# Altium footprint library Footprint.PcbLib: 137 footprints (part 9 of 9)
Each footprint in its own frame and in the unit in brackets; x right, y up, seen from the top. Pads: shape width x height; smd on the part's side, far side on the other; paste and mask are expansions set on the pad; w line width, h text height; cw(c..) or ccw(c..) is an arc to the next point about the centre after c.
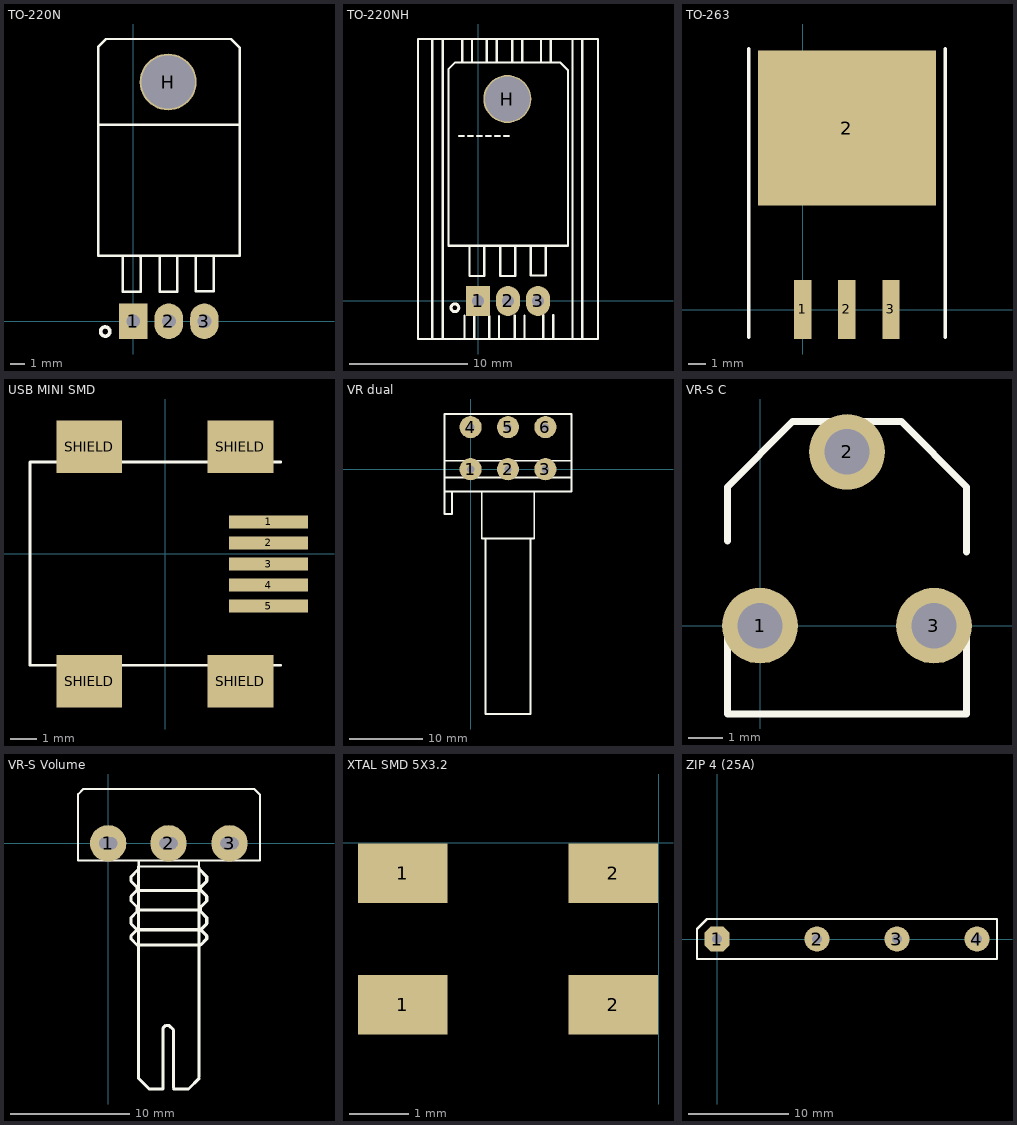
[diagram p8: the footprints below, top view; thin cyan lines are the x and y axes]

## TO-220N [mil] "TO-220 - 1-2-3"
height 200
pads (4):
  rect 80x100 hole 39: 1(0,0)
  oval 80x100 hole 39: 2(100,0) 3(200,0)
  round 160 hole 150: H(98,673)
Top Overlay:
  circle w10: c-79.03,-29 r12.97
  lines w7: -99,549 -99,772 -77,794 275,794 300,769 300,730 ; -99,552 -99,184 300,184 300,553 -98,553 ; -29,178 -29,83 21,83 21,180 20,181 ; 74,178 74,83 124,83 124,180 123,181 ; 176,180 176,85 226,85 226,182 225,183 ; 300,552 300,733
3D body "SW3dPS-mje-700 and 800.STEP": height 121, standoff -160, extent -48,-10.31 252,792.31

## TO-220NH [mil] "TO-220 - 1-2-3"
height 200
pads (4):
  rect 80x100 hole 39: 1(0,0)
  oval 80x100 hole 39: 2(100,0) 3(200,0)
  round 160 hole 150: H(98,673)
Top Overlay:
  circle w10: c-77.03,-23 r12.97
  lines w7: -99,549 -99,772 -77,794 275,794 300,769 300,730 ; -99,552 -99,184 300,184 300,553 ; -29,178 -29,83 21,83 21,180 20,181 ; 74,178 74,83 124,83 124,180 123,181 ; 176,180 176,85 226,85 226,182 225,183 ; 300,552 300,733
  lines w8: -152,-127 -152,873 ; -117,-127 -117,873 ; -53,796 -53.01,869.97 ; -45,-124 -45.01,-50.03 ; -20,796 -20.01,869.97 ; -12,-124 -12.01,-50.03 ; 29,795 28.99,868.97 ; 37,-125 36.99,-51.03 ; 62,795 61.99,868.97 ; 70,-125 69.99,-51.03 ; 114,796 113.99,869.97 ; 122,-124 121.99,-50.03 ; 147,796 146.99,869.97 ; 155,-124 154.99,-50.03 ; 210,798 209.99,871.97 ; 218,-122 217.99,-48.03 ; 243,798 242.99,871.97 ; 251,-122 250.99,-48.03 ; 315,-127 315,873 ; 348,-127 348,873 ; -200,-127 -200,873 400,873 400,-127 -200,-127
  text "------" at -69,527 h60
3D body "SW3DPS-TO-220-DEFAULT.STEP": height 165.35, standoff -118.11, extent -100,-3.66 300,763.66

## TO-263 [mm] "TO-263"
pads (4):
  rect 1x3.4 smd: 1(-0.006,0.009) 2(2.534,0.009) 3(5.074,0.009)
  rect 10.25x8.9 smd: 2(2.534,10.459)
Top Overlay:
  lines w0.2: -3.106,-1.591 -3.106,15.009 ; 8.194,-1.591 8.194,15.009
3D body: height 0.5, standoff 0, extent -0.381,-1.143 0.381,1.01
3D body: height 4.5, standoff 0, extent -2.46,3.81 7.54,13.01
3D body: height 1.3, standoff 0, extent -2.46,13.01 7.54,14.21
3D body: height 2.9, standoff 2.4, extent -0.6,1.01 0.6,3.81
3D body: height 2.9, standoff 2.4, extent 1.94,2.375 3.14,3.81
3D body: height 2.9, standoff 2.4, extent 4.475,1 5.675,3.8
3D body: height 0.5, standoff 0, extent 4.694,-1.153 5.456,1
3D body: height 2.9, standoff 0, extent -0.381,0.76 0.381,1.26
3D body: height 2.9, standoff 0, extent 4.694,0.75 5.456,1.25

## USB MINI SMD [mm] "USB MINI SMD"
pads (9):
  rect 3x0.5 smd: 1(3.929,1.219) 2(3.929,0.419) 3(3.929,-0.381) 4(3.929,-1.181) 5(3.929,-1.981)
  rect 2.5x2 smd: SHIELD(-2.889,-4.831) SHIELD(-2.889,4.069) SHIELD(2.861,-4.831) SHIELD(2.861,4.069)
Top Overlay:
  lines w0.1: 4.386,-4.231 -5.139,-4.231 -5.139,3.494 4.386,3.494
  text "." at 4.754,2.219 h0.5
3D body "USB_mini_B.STEP": height 3.95, standoff -1, extent -5.746,-5.756 3.454,4.944

## VR dual [mm] "VR doi volume"
pads (6):
  round 3 hole 1: 1(0,0) 2(5.08,0) 3(10.16,0) 4(0,5.715) 5(5.08,5.715) 6(10.16,5.715)
Top Overlay:
  lines w0.254: -3.556,-3.048 13.716,-3.048 13.716,7.493 -3.556,7.493 -3.556,-6.096 -2.54,-6.096 -2.54,-3.048 ; -3.556,-1.143 13.716,-1.143 ; -3.556,1.143 13.716,1.143 ; 1.524,-3.048 1.524,-9.398 8.636,-9.398 8.636,-3.048 ; 2.032,-9.398 2.032,-33.223 8.128,-33.223 8.128,-9.398
3D body "User Library-ALPHA-potentiometer stereo PCB mount.step": height 21.2, standoff -3.3, extent -3.42,-33.36 13.58,7.49

## VR-S C [mil] "VR don cuc ao"
pads (3):
  round 87 hole 52: 1(0,0) 2(100,200) 3(200,0)
Top Overlay:
  lines w8: -37.5,-90.23 -37.5,-2.73 -37.5,-101.5 237.5,-101.5 237.5,9.77 237.5,-90.23 ; -37.5,159.77 -37.5,97.27 -37.5,159.77 ; -37.5,159.77 37.5,234.77 ; -37.5,159.77 37.5,234.77 ; 37.5,234.77 162.5,234.77 ; 37.5,234.77 162.5,234.77 ; 162.5,234.77 237.5,159.77 ; 162.5,234.77 237.5,159.77 ; 237.5,159.77 237.5,84.77 237.5,159.77
3D body "User Library-Trimmer, 3306F-1.STEP": height 300, standoff -119.49, extent -34.55,-96.87 233.56,228

## VR-S Volume [mil] "VR don volume"
pads (3):
  round 120 hole 40 slot 60 at 0 deg: 1(0,0) 2(199,0) 3(400,0)
Top Overlay:
  lines w7: 100,-57 100,-77 299,-77 299,-57 ; 101,-77 101,-57 ; -99,-57 -99,162 -82,179 482,179 500,161 500,-57 -99,-57
  lines w10: 95,-335 75,-315 75,-305 95,-285 75,-265 75,-245 95,-225 95,-210 75,-190 75,-175 95,-155 95,-145 75,-125 75,-110 100,-85 ; 95,-220 300,-220 ; 100,-770 100,-77 ; 100,-760 100,-775 135,-810 180,-810 180,-610 190,-600 200,-600 215,-615 215,-805 ; 100,-335 305,-335 325,-315 325,-305 305,-285 ; 100,-285 305,-285 ; 105,-155 300,-155 ; 215,-810 265,-810 300,-775 ; 300,-770 300,-80 ; 300,-85 325,-110 325,-125 305,-145 305,-155 325,-175 325,-190 305,-210 305,-225 325,-245 325,-265 305,-285
3D body "SW3dPS-Pot.STEP": height 839.35, standoff -130, extent -110,-818.11 510,188.11

## XTAL SMD 5X3.2 [mil] "XTAL SMD 5MMX3.2MM"
pads (4):
  rect 59.06x39.37 smd: 1(-169,-107) 1(-169,-20) 2(-30,-107) 2(-30,-20)
3D body "User Library-CRYSTALSMD5X32.step": height 39.37, standoff 0, extent -198.43,-125.98 -1.57,0

## ZIP 4 (25A) [mm] "diode brigde 25A"
pads (4):
  oct 2.5x2.5 hole 1: 1(0,0)
  round 2.5 hole 1: 2(10,0) 3(18,0) 4(26,0)
Top Overlay:
  lines w0.2: -2,-2 28,-2 28,2 -1,2 -2,1 -2,-2